# Altium footprint library Footprint-Lib-PhilsLab.PcbLib: 237 footprints (part 11 of 15)
Each footprint in its own frame and in the unit in brackets; x right, y up, seen from the top. Pads: shape width x height; smd on the part's side, far side on the other; paste and mask are expansions set on the pad; w line width, h text height; cw(c..) or ccw(c..) is an arc to the next point about the centre after c.
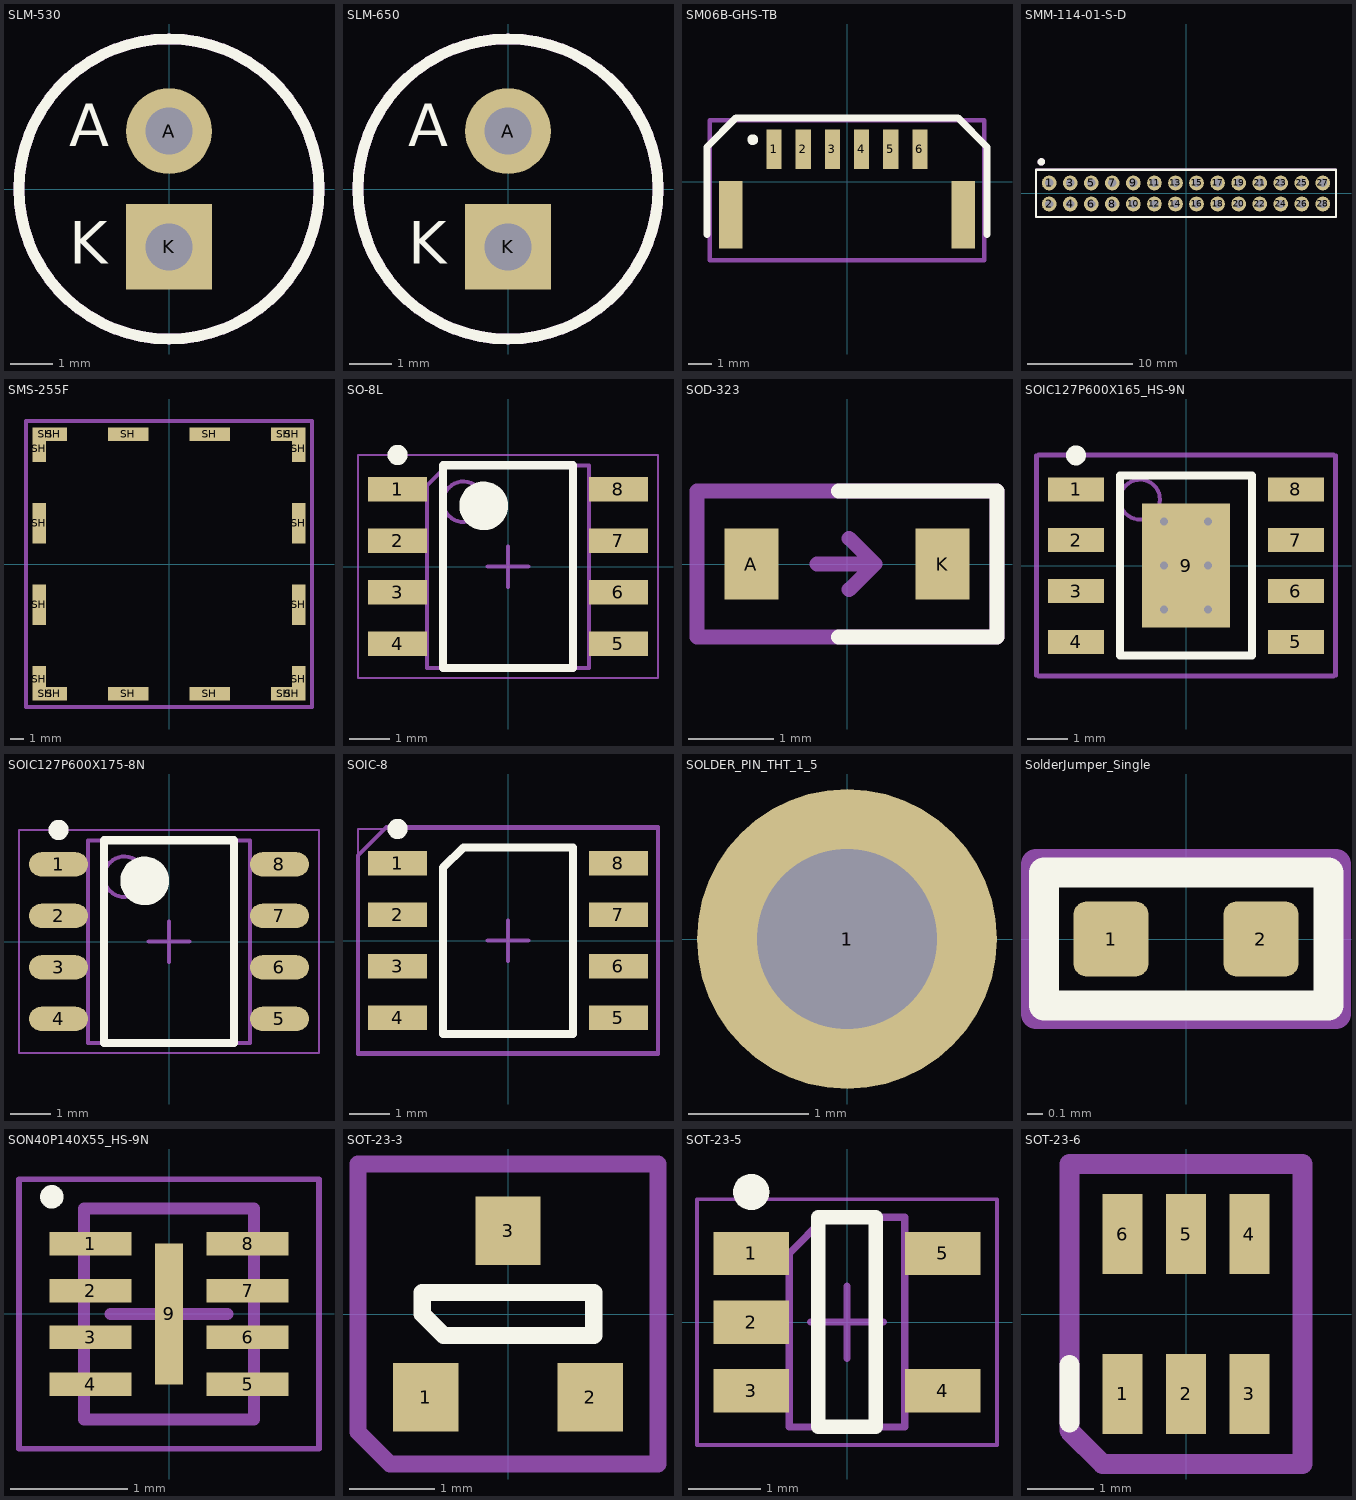
[diagram p10: the footprints below, top view; thin cyan lines are the x and y axes]

## SLM-530 [mm]
pads (2):
  round 2 hole 1.1: A(0,1.35)
  rect 2x2 hole 1.1: K(0,-1.35)
Top Overlay:
  circle w0.254: c0,0 r3.5
  text "K" at -2.333,-1.75 h1
  text "A" at -2.333,1 h1
Bottom Overlay:
  circle w0.254: c0,0 r3.5
  text "A" at -1.667,1 h1
  text "K" at -1.667,-1.75 h1
Mechanical 13:
  circle w0.254: c0,0 r3.5
  text "K" at -0.333,-1.75 h1
  text "A" at -0.333,1 h1
  text "'.Designator'" at -5.665,-0.417 h1
3D body "SLM-530.step": height 17.79, standoff 0.01, extent -3.683,-3.683 3.683,3.683
3D body "LED-5mm.STEP": height 22.8, standoff -13, extent -3,-2.5 3,3

## SLM-650 [mm]
pads (2):
  round 2 hole 1.1: A(0,1.35)
  rect 2x2 hole 1.1: K(0,-1.35)
Top Overlay:
  circle w0.254: c0,0 r3.5
  text "K" at -2.333,-1.75 h1
  text "A" at -2.333,1 h1
Bottom Overlay:
  circle w0.254: c0,0 r3.5
  text "A" at -1.667,1 h1
  text "K" at -1.667,-1.75 h1
Mechanical 13:
  circle w0.254: c0,0 r3.5
  text "K" at -0.333,-1.75 h1
  text "A" at -0.333,1 h1
  text "'.Designator'" at -5.665,-0.417 h1
3D body "SLM-650.step": height 20.84, standoff 0.01, extent -3.683,-3.683 3.683,3.683
3D body "LED-5mm.STEP": height 25.85, standoff -9.95, extent -2.99,-2.5 2.99,3

## SM06B-GHS-TB [mm]
pads (8):
  rect 0.65x1.7 smd: 1(-3.125,1.4) 2(-1.875,1.4) 3(-0.625,1.4) 4(0.625,1.4) 5(1.875,1.4) 6(3.125,1.4)
  rect 1x2.9 smd: ""(-4.975,-1.4) ""(4.975,-1.4)
Top Overlay:
  circle w0.254: c-4.035,1.813 r0.103
  lines w0.3: -6,-2.25 -6,1.5 -4.75,2.75 4.75,2.75 6,1.5 6,-2.25
Mechanical 13:
  circle w0.25: c-3.125,1.75 r0.1
  lines w0.2: -5.875,-3.35 -5.875,-1.35 -5.875,2.65 5.875,2.65 5.875,-3.35 -5.875,-3.35
  text "'.Designator'" at -5.665,-0.417 h1
3D body "SM06B-GHS-TB.STEP": height 4.26, standoff 0.01, extent -5.375,-2.8 5.375,2.05

## SMM-114-01-S-D [mm]
pads (28):
  round 1.4 hole 0.8 paste-0.5: 1(-13,1) 2(-13,-1) 3(-11,1) 4(-11,-1) 5(-9,1) 6(-9,-1) 7(-7,1) 8(-7,-1) 9(-5,1) 10(-5,-1) 11(-3,1) 12(-3,-1) 13(-1,1) 14(-1,-1) 15(1,1) 16(1,-1) 17(3,1) 18(3,-1) 19(5,1) 20(5,-1) 21(7,1) 22(7,-1) 23(9,1) 24(9,-1) 25(11,1) 26(11,-1) 27(13,1) 28(13,-1)
Top Overlay:
  circle w0.5: c-13.75,3 r0.1
  lines w0.2: -14.25,-2.25 -14.25,2.25 14.25,2.25 14.25,-2.25 -14.25,-2.25
Mechanical 13:
  circle w0.5: c-13.75,3 r0.1
  lines w0.2: -14.25,-2.25 14.25,-2.25 14.25,2.25 -14.25,2.25 -14.25,-2.25
  text "2" at -13.483,-1.65 h1
  text "1" at -13.317,0.35 h1
  text "'.Designator'" at -5.815,-0.9 h1
3D body "SMM-114-01-S-D.stp": height 3.57, standoff -3.04, extent -13.993,-2 13.993,2

## SMS-255F [mm]
pads (20):
  rect 1x1.91 smd: SH(-9.525,-8.455) SH(-9.525,8.455) SH(9.525,-8.455) SH(9.525,8.455)
  rect 1x3 smd: SH(-9.525,-3) SH(-9.525,3) SH(9.525,-3) SH(9.525,3)
  rect 1.91x1 smd: SH(-9.07,-9.525) SH(-9.07,9.525) SH(-8.455,-9.525) SH(-8.455,9.525) SH(8.455,-9.525) SH(8.455,9.525) SH(9.07,-9.525) SH(9.07,9.525)
  rect 3x1 smd: SH(-3,-9.525) SH(-3,9.525) SH(3,-9.525) SH(3,9.525)
Mechanical 13:
  lines w0.3: -10.5,-10.5 10.5,-10.5 10.5,10.5 -10.5,10.5 -10.5,-7.5 -10.5,-10.5
  text "'.Designator'" at -5.84,-0.925 h1
3D body "SMS-255F.STEP": height 5.21, standoff 0, extent -9.925,-9.925 9.925,9.925

## SO-8L [mm] "SOIC, 8-Leads, Body 4.90x3.90mm, Pitch 1.27mm, IPC Medium Density"
height 1.75
pads (8):
  rect 1.45x0.6 smd: 1(-2.725,1.905) 2(-2.725,0.635) 3(-2.725,-0.635) 4(-2.725,-1.905) 5(2.725,-1.905) 6(2.725,-0.635) 7(2.725,0.635) 8(2.725,1.905)
Top Overlay:
  circle w0.6: c-0.6,1.5 r0.3
  circle w0.25: c-2.725,2.755 r0.125
  lines w0.2: -1.6,-2.5 1.6,-2.5 1.6,2.5 -1.6,2.5 -1.6,-2.5
Mechanical 13:
  circle w0.1: c-1.1,1.6 r0.5
  lines w0.1: -2,-2.5 2,-2.5 2,2.5 -1.5,2.5 -2,2 -2,-2.5
  text "'.Designator'" at -7.752,-1.087 h1.25
Mechanical 15:
  lines w0.05: -3.7,-2.75 3.7,-2.75 3.7,2.75 -3.7,2.75 -3.7,-2.75
  lines w0.1: -0.5,0 0.5,0 ; 0,-0.5 0,0.5
3D body "SO-8L.step": height 1.75, standoff 0, extent -3,-2.5 3,2.5

## SOD-323 [mm]
pads (2):
  rect 0.63x0.83 smd: A(-1.115,0) K(1.115,0)
Top Overlay:
  lines w0.175: -0.1,-0.85 1.75,-0.85 1.75,0.85 -0.1,0.85
Mechanical 13:
  lines w0.175: -0.35,0 0.325,0 ; 0.025,-0.3 0.325,0 ; 0.025,0.3 0.325,0 ; -1.75,-0.85 1.75,-0.85 1.75,0.85 -1.75,0.85 -1.75,-0.85
  text "'.Designator'" at -5.677,-0.417 h1
3D body "SOD-323.step": height 1.1, standoff 0, extent -1.3,-0.675 1.3,0.675

## SOIC127P600X165_HS-9N [mm] "SOIC, 8-Leads, Body 4.90x3.90mm, Pitch 1.27mm, Thermal Pad 3.10x2.21mm, IPC Medium Density"
height 1.65
pads (9):
  rect 1.4x0.6 smd: 1(-2.75,1.905) 2(-2.75,0.635) 3(-2.75,-0.635) 4(-2.75,-1.905) 5(2.75,-1.905) 6(2.75,-0.635) 7(2.75,0.635) 8(2.75,1.905)
  rect 2.21x3.1 smd: 9(0,0)
via -0.55,1.1 diameter 0.5 hole 0.2
via 0.55,1.1 diameter 0.5 hole 0.2
via -0.55,0 diameter 0.5 hole 0.2
via 0.55,0 diameter 0.5 hole 0.2
via -0.55,-1.1 diameter 0.5 hole 0.2
via 0.55,-1.1 diameter 0.5 hole 0.2
Top Overlay:
  circle w0.25: c-2.75,2.755 r0.125
  lines w0.2: -1.65,-2.25 -1.65,2.25 1.65,2.25 1.65,-2.25 -1.65,-2.25
Mechanical 13:
  circle w0.1: c-1.15,1.65 r0.5
  lines w0.1: -3.75,-2.75 -3.75,2.75 3.75,2.75 3.75,-2.75 -3.75,-2.75
Mechanical 15:
  lines w0.05: -3.7,-2.8 -3.7,2.8 3.7,2.8 3.7,-2.8 -3.7,-2.8
  lines w0.1: -0.5,0 0.5,0 ; 0,-0.5 0,0.5
3D body "SOIC127P600X165_HS-9N.step": height 1.65, standoff 0, extent -3,-2.55 3,2.55

## SOIC127P600X175-8N [mm] "SOIC, 8-Leads, Body 4.91x3.90mm, Pitch 1.27mm, IPC Medium Density"
height 1.75
pads (8):
  oval 1.45x0.6 smd: 1(-2.725,1.905) 2(-2.725,0.635) 3(-2.725,-0.635) 4(-2.725,-1.905) 5(2.725,-1.905) 6(2.725,-0.635) 7(2.725,0.635) 8(2.725,1.905)
Top Overlay:
  circle w0.6: c-0.6,1.5 r0.3
  circle w0.25: c-2.725,2.755 r0.125
  lines w0.2: -1.6,-2.5 1.6,-2.5 1.6,2.5 -1.6,2.5 -1.6,-2.5
Mechanical 13:
  circle w0.1: c-1.1,1.6 r0.5
  lines w0.1: -2,-2.5 2,-2.5 2,2.5 -2,2.5 -2,-2.5
Mechanical 15:
  lines w0.05: -3.7,-2.75 3.7,-2.75 3.7,2.75 -3.7,2.75 -3.7,-2.75
  lines w0.1: -0.5,0 0.5,0 ; 0,-0.5 0,0.5
3D body "SOIC127P600X175-8N.step": height 1.75, standoff 0, extent -2.997,-2.5 2.997,2.5

## SOIC-8 [mm] "SOIC, 8-Leads, Body 4.91x3.90mm, Pitch 1.27mm, IPC Medium Density"
height 1.75
pads (8):
  rect 1.45x0.6 smd: 1(-2.725,1.905) 2(-2.725,0.635) 3(-2.725,-0.635) 4(-2.725,-1.905) 5(2.725,-1.905) 6(2.725,-0.635) 7(2.725,0.635) 8(2.725,1.905)
Top Overlay:
  circle w0.25: c-2.725,2.755 r0.125
  lines w0.2: -1.6,-2.3 -1.6,1.8 -1.1,2.3 1.6,2.3 1.6,-2.3 -1.6,-2.3
Mechanical 13:
  lines w0.1: -3.7,-2.8 -3.7,2.1 -3,2.8 3.7,2.8 3.7,-2.8 -3.7,-2.8
  text "'.Designator'" at -6.315,-1.4 h1
Mechanical 15:
  lines w0.05: -3.7,-2.75 3.7,-2.75 3.7,2.75 -3.7,2.75 -3.7,-2.75
  lines w0.1: -0.5,0 0.5,0 ; 0,-0.5 0,0.5
3D body "SOIC-8.step": height 1.75, standoff 0, extent -2.997,-2.5 2.997,2.5

## SOLDER_PIN_THT_1_5 [mm]
pads (1):
  round 2.5 hole 1.5: 1(0,0)

## SolderJumper_Single [mm]
pads (2):
  rrect35% 0.5x0.5 smd mask+0: 1(-0.5,0) 2(0.5,0)
Top Overlay:
  lines w0.2: -0.948,-0.444 0.95,-0.444 0.95,0.444 -0.948,0.444 -0.948,0.048 -0.948,-0.444
Top Solder:
  region: -0.5,0.25 0.5,0.25 0.5,-0.25 -0.5,-0.25
Mechanical 13:
  lines w0.2: -1,-0.5 -1,0.5 1,0.5 1,-0.5 -1,-0.5
  text "'.Designator'" at -5.84,-0.925 h1

## SON40P140X55_HS-9N [mm] "SON, 8-Leads, Body 1,70x1,35mm, Pitch 0,40mm, Thermal Pad 1,20x0,24mm, IPC Medium Density"
height 0.55
pads (9):
  rect 0.7x0.2 smd mask+0.05: 1(-0.67,0.6) 2(-0.67,0.2) 3(-0.67,-0.2) 4(-0.67,-0.6) 5(0.67,-0.6) 6(0.67,-0.2) 7(0.67,0.2) 8(0.67,0.6)
  rect 0.24x1.2 smd mask+0.05: 9(0,0)
Top Overlay:
  circle w0.1: c-1,1 r0.05
Mechanical 13:
  lines w0.1: -0.725,-0.9 -0.725,0.9 0.725,0.9 0.725,-0.9 -0.725,-0.9
  text "'.Designator'" at -5.84,-0.925 h1
Mechanical 15:
  lines w0.05: -1.28,-1.15 -1.28,1.15 1.28,1.15 1.28,-1.15 -1.28,-1.15
  lines w0.1: -0.5,0 0.5,0 ; 0,-0.5 0,0.5
3D body "SON40P140X55_HS-9N.step": height 0.55, standoff 0, extent -0.726,-0.9 0.726,0.9

## SOT-23-3 [mm]
pads (3):
  rect 0.764x0.8 smd: 1(-0.96,-0.97) 2(0.96,-0.97) 3(0,0.97)
Top Overlay:
  lines w0.2: -1,0 -0.75,-0.25 1,-0.25 1,0.25 -1,0.25 -1,0
Mechanical 13:
  lines w0.2: -1.75,-1.377 -1.75,1.75 1.75,1.75 1.75,-1.75 -1.377,-1.75 -1.75,-1.377
  text "'.Designator'" at -5.84,-0.925 h1
3D body "SOT-23-3.stp": height 1.01, standoff 0.01, extent -1.45,-1.15 1.45,1.15

## SOT-23-5 [mm] "SOT23, 5-Leads, Body 2,90x2,80mm, Pitch 0,95mm, IPC Medium Density"
height 1.45
pads (5):
  rect 1.05x0.6 smd: 1(-1.325,0.95) 2(-1.325,0) 3(-1.325,-0.95) 4(1.325,-0.95) 5(1.325,0.95)
Top Overlay:
  circle w0.25: c-1.325,1.8 r0.125
  lines w0.2: -0.4,-1.45 -0.4,1.45 0.4,1.45 0.4,-1.45 -0.4,-1.45
Mechanical 13:
  lines w0.1: -0.8,-1.45 0.8,-1.45 0.8,1.45 -0.3,1.45 -0.8,0.95 -0.8,-1.45
Mechanical 15:
  lines w0.05: -2.075,-1.7 2.075,-1.7 2.075,1.7 -2.075,1.7 -2.075,-1.7
  lines w0.1: -0.5,0 0.5,0 ; 0,-0.5 0,0.5
3D body "SOT95P280X145-5N.step": height 1.45, standoff 0, extent -1.4,-1.45 1.4,1.45

## SOT-23-6 [mm]
pads (6):
  rect 0.6x1.2 smd: 1(-0.95,-1.2) 2(0,-1.2) 3(0.95,-1.2) 4(0.95,1.2) 5(0,1.2) 6(-0.95,1.2)
Top Overlay:
  lines w0.3: -1.75,-1.628 -1.75,-0.761
Mechanical 13:
  lines w0.3: -1.75,-1.75 -1.25,-2.25 1.75,-2.25 1.75,2.25 -1.75,2.25 -1.75,0 -1.75,-1.75
  text "'.Designator'" at -5.84,-0.925 h1
3D body "SOT23-6.step": height 1.45, standoff 0, extent -1.45,-1.4 1.45,1.4